# Altium footprint library OSHW_LuxonisMaster_20201223.PcbLib: 112 footprints (part 5 of 7)
Each footprint in its own frame and in the unit in brackets; x right, y up, seen from the top. Pads: shape width x height; smd on the part's side, far side on the other; paste and mask are expansions set on the pad; w line width, h text height; cw(c..) or ccw(c..) is an arc to the next point about the centre after c.
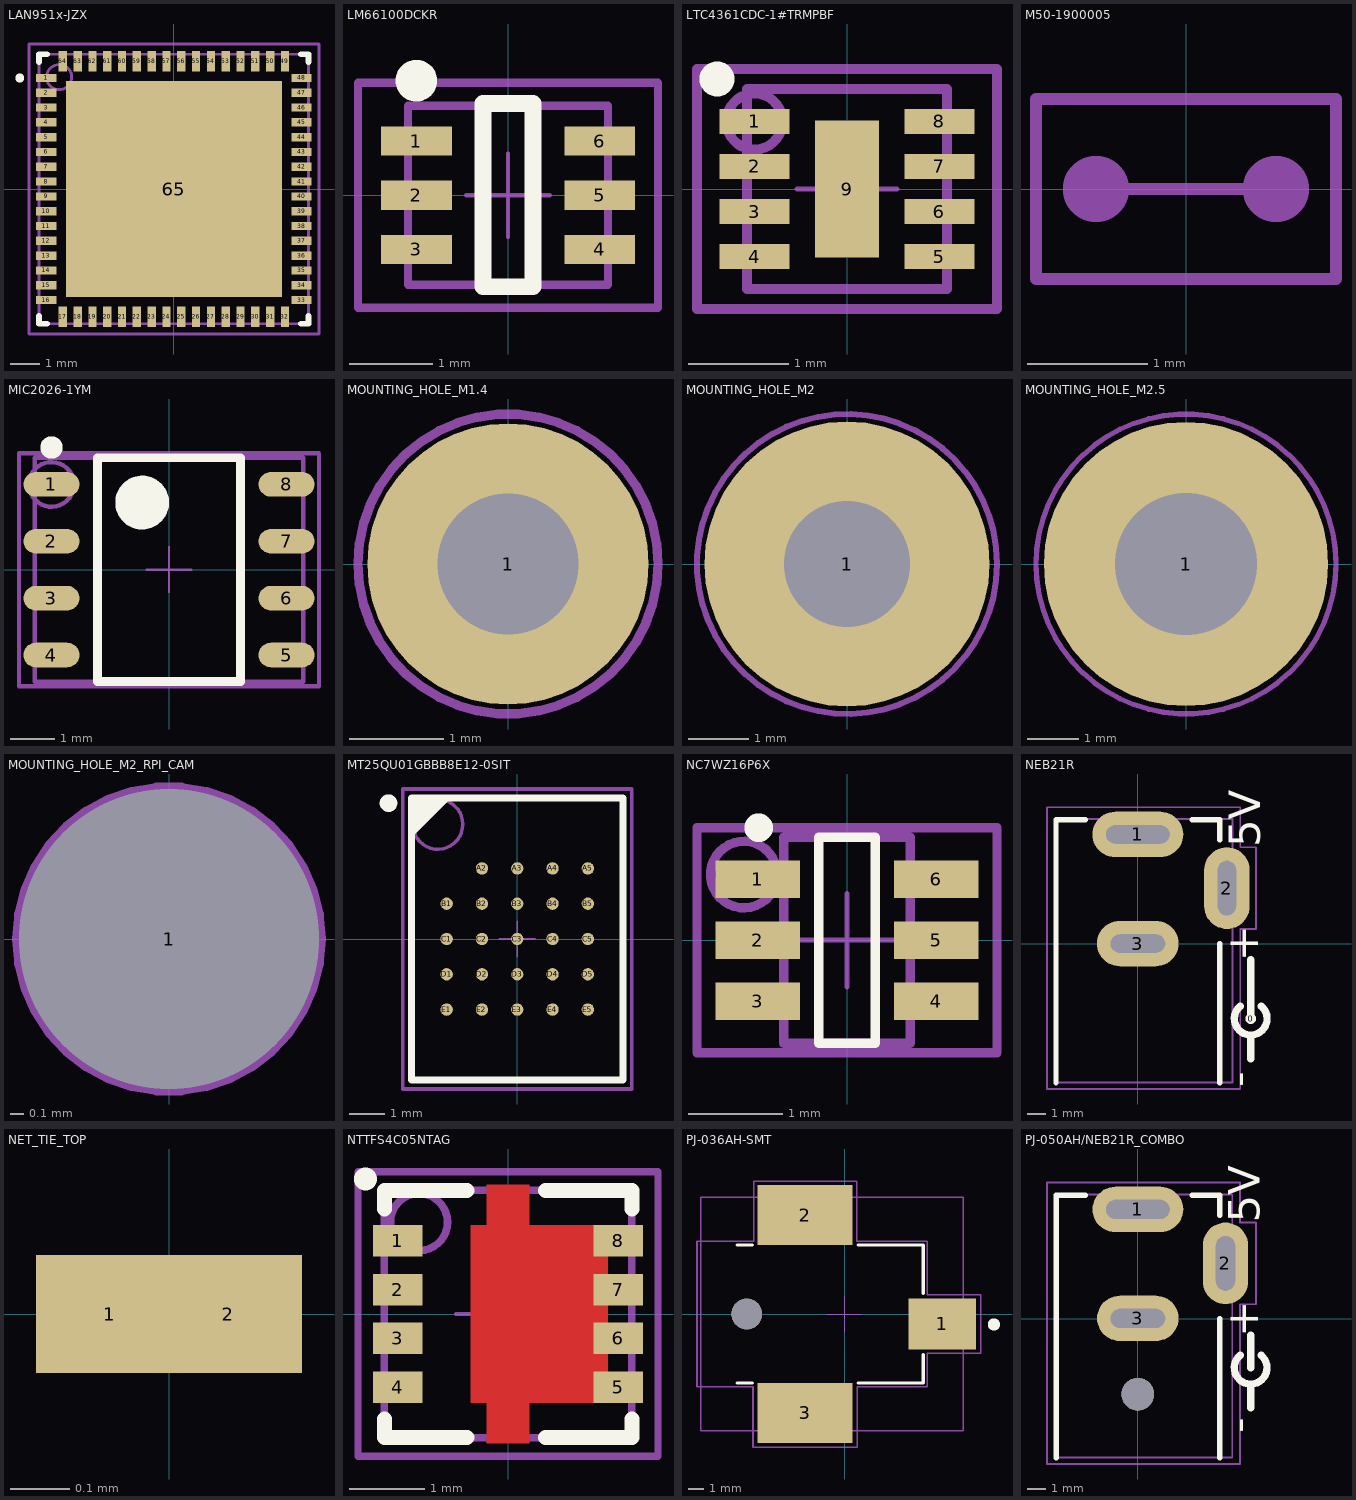
[diagram p4: the footprints below, top view; thin cyan lines are the x and y axes]

## LAN951x-JZX [mm] "LAN9513 or LAN9514 QFN, 64-Leads, Body 9.1x9.1mm, Pitch 0.5mm, Thermal Pad 7.3x7.3mm"
height 1
pads (65):
  rect 0.69x0.28 smd: 1(-4.31,3.75) 2(-4.31,3.25) 3(-4.31,2.75) 4(-4.31,2.25) 5(-4.31,1.75) 6(-4.31,1.25) 7(-4.31,0.75) 8(-4.31,0.25) 9(-4.31,-0.25) 10(-4.31,-0.75) 11(-4.31,-1.25) 12(-4.31,-1.75) 13(-4.31,-2.25) 14(-4.31,-2.75) 15(-4.31,-3.25) 16(-4.31,-3.75) 33(4.31,-3.75) 34(4.31,-3.25) 35(4.31,-2.75) 36(4.31,-2.25) 37(4.31,-1.75) 38(4.31,-1.25) 39(4.31,-0.75) 40(4.31,-0.25) 41(4.31,0.25) 42(4.31,0.75) 43(4.31,1.25) 44(4.31,1.75) 45(4.31,2.25) 46(4.31,2.75) 47(4.31,3.25) 48(4.31,3.75)
  rect 0.28x0.69 smd: 17(-3.75,-4.31) 18(-3.25,-4.31) 19(-2.75,-4.31) 20(-2.25,-4.31) 21(-1.75,-4.31) 22(-1.25,-4.31) 23(-0.75,-4.31) 24(-0.25,-4.31) 25(0.25,-4.31) 26(0.75,-4.31) 27(1.25,-4.31) 28(1.75,-4.31) 29(2.25,-4.31) 30(2.75,-4.31) 31(3.25,-4.31) 32(3.75,-4.31) 49(3.75,4.31) 50(3.25,4.31) 51(2.75,4.31) 52(2.25,4.31) 53(1.75,4.31) 54(1.25,4.31) 55(0.75,4.31) 56(0.25,4.31) 57(-0.25,4.31) 58(-0.75,4.31) 59(-1.25,4.31) 60(-1.75,4.31) 61(-2.25,4.31) 62(-2.75,4.31) 63(-3.25,4.31) 64(-3.75,4.31)
  rect 7.3x7.3 smd: 65(0,0)
Top Overlay:
  circle w0.25: c-5.205,3.75 r0.025
  lines w0.2: -4.55,-4.29 -4.55,-4.55 -4.29,-4.55 ; -4.55,4.29 -4.55,4.55 -4.29,4.55 ; 4.29,-4.55 4.55,-4.55 4.55,-4.29 ; 4.29,4.55 4.55,4.55 4.55,4.29
Top Assembly:
  lines w0.1: -3.483,3.616 cw(c-3.875,3.778) -3.471,3.65 ; -4.9,-4.9 4.9,-4.9 4.9,4.9 -4.9,4.9 -4.9,-4.9
  text "'.Designator'" at 0,0 h1
Top Courtyard:
  lines w0.05: -0.5,0 0.5,0 ; 0,-0.5 0,0.5 ; -4.9,-4.9 -4.9,4.9 4.9,4.9 4.9,-4.9 -4.9,-4.9
Top Component Outline:
  lines w0.1: -4.55,-4.55 -4.55,4.55 4.55,4.55 4.55,-4.55 -4.55,-4.55
3D body: height 1, standoff 0, extent -4.55,-4.55 4.55,4.55

## LM66100DCKR [mm] "SOT23, 6-Leads, Body 2.00x2.10mm, Pitch 0.65mm, IPC Medium Density"
height 1.1
pads (6):
  rect 0.85x0.35 smd: 1(-1.1,0.65) 2(-1.1,0) 3(-1.1,-0.65) 4(1.1,-0.65) 5(1.1,0) 6(1.1,0.65)
Top Overlay:
  circle w0.25: c-1.1,1.375 r0.125
  lines w0.2: -0.3,-1.1 0.3,-1.1 0.3,1.1 -0.3,1.1 -0.3,-1.1
Top Assembly:
  lines w0.1: -1.8,-1.35 -1.8,1.35 1.8,1.35 1.8,-1.35 -1.8,-1.35
  text "'.Designator'" at 0,0.188 h1
Top Courtyard:
  lines w0.05: -0.5,0 0.5,0 ; 0,-0.5 0,0.5 ; -1.8,-1.35 -1.8,1.35 1.8,1.35 1.8,-1.35 -1.8,-1.35
Top Component Outline:
  lines w0.1: -1.2,-1.075 -1.2,1.075 1.2,1.075 1.2,-1.075 -1.2,-1.075
3D body "SOT65P210X110-6N.step": height 1.1, standoff 0, extent -1.2,-1.075 1.2,1.075

## LTC4361CDC-1#TRMPBF [mm] "8-WFDFN Exposed Pad"
height 0.8
pads (9):
  rect 0.7x0.25 smd mask+0.05: 1(-0.925,0.675) 2(-0.925,0.225) 3(-0.925,-0.225) 4(-0.925,-0.675) 5(0.925,-0.675) 6(0.925,-0.225) 7(0.925,0.225) 8(0.925,0.675)
  rect 0.64x1.37 smd paste-0.2 mask+0.05: 9(0,0)
Top Overlay:
  circle w0.2: c-1.3,1.1 r0.075
Top Assembly:
  circle w0.1: c-0.925,0.675 r0.28
  lines w0.1: -1.5,-1.2 1.5,-1.2 1.5,1.2 -1.5,1.2 -1.5,-1.2
  text "'.Designator'" at 0,0 h1
Top Courtyard:
  lines w0.05: -0.5,0 0,0 ; 0,-0.5 0,0 ; 0,0.5 0,0 ; 0.5,0 0,0 ; -1.5,-1.2 1.5,-1.2 1.5,1.2 -1.5,1.2 -1.5,-1.2
Top Component Outline:
  lines w0.1: -1.001,-1 -1.001,1 1.001,1 1.001,-1 -1.001,-1
3D body "User Library-DFN 8.STEP": height 0.75, standoff -0.05, extent -1.001,-1 1.001,1

## M50-1900005 [mm] "Shunt for 1.27mm headers"
height 3
Top Assembly:
  circle w0.5: c0.75,0 r0.025
  circle w0.5: c-0.75,0 r0.025
  lines w0.1: -0.6,0 0.625,0 ; -1.25,-0.75 -1.25,0.75 1.25,0.75 1.25,-0.75 -1.25,-0.75
  text "'.Designator'" at 0,0 h1
3D body: height 0.84, standoff -0.61, extent 0,0 0,0
3D body: height 4.5, standoff 1.5, extent -1.25,-0.75 1.25,0.75
3D body: height 0.84, standoff -0.61, extent 0.6,0 0.6,0

## MIC2026-1YM [mm] "SOIC, 8-Leads, Body 5x4mm, Pitch 1.27mm, IPC High Density"
height 1.73
pads (8):
  oval 1.25x0.55 smd: 1(-2.625,1.905) 2(-2.625,0.635) 3(-2.625,-0.635) 4(-2.625,-1.905) 5(2.625,-1.905) 6(2.625,-0.635) 7(2.625,0.635) 8(2.625,1.905)
Top Overlay:
  circle w0.6: c-0.6,1.5 r0.3
  circle w0.25: c-2.625,2.73 r0.125
  lines w0.2: -1.6,-2.5 1.6,-2.5 1.6,2.5 -1.6,2.5 -1.6,-2.5
Top Assembly:
  circle w0.1: c-2.625,1.905 r0.5
  lines w0.1: -3.35,-2.6 -3.35,2.6 3.35,2.6 3.35,-2.6 -3.35,-2.6
  text "'.Designator'" at 0,0 h1
Top Courtyard:
  lines w0.05: -0.5,0 0.5,0 ; 0,-0.5 0,0.5 ; -3.35,-2.6 3.35,-2.6 3.35,2.6 -3.35,2.6 -3.35,-2.6
Top Component Outline:
  lines w0.1: -2.995,-2.5 2.995,-2.5 2.995,2.5 -2.995,2.5 -2.995,-2.5
3D body "SOIC127P600X173-8L.step": height 1.73, standoff 0, extent -2.995,-2.5 2.995,2.5

## MOUNTING_HOLE_M1.4 [mm] "M1.4 screw footprint. 1.5mm dia hole, 3mm dia ring,"
pads (1):
  round 3 hole 1.5 mask+0.05: 1(0,0)
Top Assembly:
  circle w0.1: c0,0 r1.6
  text "'.Designator'" at 0,0 h1
Bottom Assembly:
  circle w0.1: c0,0 r1.6
  text "'.Designator'" at 0,0 h1
Top Courtyard:
  circle w0.05: c0,0 r1.6
Bottom Courtyard:
  circle w0.05: c0,0 r1.6

## MOUNTING_HOLE_M2 [mm] "M1.4 screw footprint. 2.1 mm dia hole, 4.75mm dia ring,"
pads (1):
  round 4.75 / inner round 2.2 / far side round 4.75 hole 2.1 mask+0.05: 1(0,0)
Top Assembly:
  circle w0.1: c0,0 r2.5
  text "'.Designator'" at 0,0 h1
Bottom Assembly:
  circle w0.1: c0,0 r2.5
  text "'.Designator'" at 0,0 h1
Top Courtyard:
  circle w0.05: c0,0 r2.5
Bottom Courtyard:
  circle w0.05: c0,0 r2.5

## MOUNTING_HOLE_M2.5 [mm] "2.7mm dia hole, 5.5mm dia ring"
pads (1):
  round 5.5 / inner round 3 / far side round 5.5 hole 2.75: 1(0,0)
Top Assembly:
  circle w0.1: c0,0 r2.9
  text "'.Designator'" at 0,0 h1
Bottom Assembly:
  circle w0.1: c0,0 r2.9
  text "'.Designator'" at 0,0 h1
Top Courtyard:
  circle w0.05: c0,0 r2.9
Bottom Courtyard:
  circle w0.05: c0,0 r2.9

## MOUNTING_HOLE_M2_RPI_CAM [mil] "NPTH 2.2mm Hole Used in Raspberry Pi Camera"
pads (1):
  round 60 hole 86.61 unplated: 1(0,0)
Top Assembly:
  circle w3.94: c0,0 r43.31
  text "'.Designator'" at 0,0 h39.37
Bottom Assembly:
  circle w3.94: c0,0 r43.31
  text "'.Designator'" at 0,0 h39.37
Top Courtyard:
  circle w1.97: c0,0 r43.31
Bottom Courtyard:
  circle w1.97: c0,0 r43.31

## MT25QU01GBBB8E12-0SIT [mm] "BGA, 24-Leads, Body 6.00x8.00mmx1.20mm, Pitch 1.00mm"
height 1.2
pads (24):
  round 0.35 smd: A2(-1,2) A3(0,2) A4(1,2) A5(2,2) B1(-2,1) B2(-1,1) B3(0,1) B4(1,1) B5(2,1) C1(-2,0) C2(-1,0) C3(0,0) C4(1,0) C5(2,0) D1(-2,-1) D2(-1,-1) D3(0,-1) D4(1,-1) D5(2,-1) E1(-2,-2) E2(-1,-2) E3(0,-2) E4(1,-2) E5(2,-2)
Top Overlay:
  circle w0.25: c-3.65,3.85 r0.125
  region: -2,4 -3,3 -3,4
  lines w0.2: -3,3 -2,4 ; -3,-4 3,-4 3,4 -3,4 -3,-4
Top Assembly:
  circle w0.1: c-2.25,3.25 r0.707
  lines w0.1: -3.25,-4.25 3.25,-4.25 3.25,4.25 -3.25,4.25 -3.25,-4.25
  text "'.Designator'" at 0,0 h1
Top Courtyard:
  lines w0.05: -0.5,0 0.5,0 ; 0,-0.5 0,0.5 ; -3.25,-4.25 3.25,-4.25 3.25,4.25 -3.25,4.25 -3.25,-4.25
Top Component Outline:
  lines w0.1: -3,-4 -3,4 3,4 3,-4 -3,-4
3D body: height 1.2, standoff 0.25, extent -3,-4 3,4

## NC7WZ16P6X [mm] "NC7WZ07P6X - SOT23, 6-Leads, Body 2.00x2.10mm, Pitch 0.65mm, IPC Medium Density"
height 1
pads (6):
  rect 0.9x0.4 smd: 1(-0.95,0.65) 2(-0.95,0) 3(-0.95,-0.65) 4(0.95,-0.65) 5(0.95,0) 6(0.95,0.65)
Top Overlay:
  circle w0.254: c-0.942,1.2 r0.025
  lines w0.1: -0.3,-1.1 -0.3,1.1 0.3,1.1 0.3,-1.1 -0.3,-1.1
Top Assembly:
  circle w0.1: c-1.1,0.7 r0.355
  lines w0.1: -1.6,-1.2 -1.6,1.2 1.6,1.2 1.6,-1.2 -1.6,-1.2
  text "'.Designator'" at 0,0 h1
Top Courtyard:
  lines w0.054: -0.5,0 0.5,0 ; 0,-0.5 0,0.5 ; -1.6,-1.2 1.6,-1.2 1.6,1.2 -1.6,1.2 -1.6,-1.2
Top Component Outline:
  lines w0.1: -0.675,-1.1 0.675,-1.1 0.675,1.1 -0.675,1.1 -0.675,-1.1
3D body: height 1.1, standoff 0, extent -0.675,-1.1 0.675,1.1

## NEB21R [mm] "2.1mm ID, 5.5mm OD, 3pin, 2contact, PJ-002AH or NEB21R"
height 11
pads (4):
  round 0.6 on Top Overlay paste+0.05 mask+0.05: 0(6.21,-4.131)
  oval 5x2.5 hole 1 slot 3.5 at 0 deg mask+0.05: 1(0,6)
  oval 2.5x4.5 hole 1 slot 3 at 90 deg mask+0.05: 2(4.9,3.05)
  oval 4.5x2.5 hole 1 slot 3 at 0 deg mask+0.05: 3(0,0)
Top Overlay:
  lines w0.3: -4.5,-7.65 -4.5,6.8 -2.9,6.8 ; 3,6.8 4.5,6.8 4.5,5.7 ; 4.5,-7.65 4.5,0
  lines w0.4: 5.631,-3.442 ccw(c6.21,-4.131) 6.788,-3.442 ; 6.21,-6.341 6.21,-5.031 ; 6.21,-4.131 6.21,-0.891
  text "5V" at 7.3,5.3 h3
  text "+" at 7.2,1 h3
  text "-" at 6.9,-7.9 h3
Top Assembly:
  lines w0.1: -5,-8 -5,7.5 5.631,7.5 5.631,5.7 5.631,5.3 6.5,5.3 6.5,0.8 5.631,0.8 5.631,-8 -5,-8
  text "'.Designator'" at 0,0 h1
Top Courtyard:
  lines w0.05: -1.25,0 0,0 ; 0,-1.3 0,0 ; 0,1.25 0,0 ; 1.3,0 0,0 ; -5,-8 5.631,-8 5.631,0.8 6.5,0.8 6.5,5.3 5.631,5.3 5.631,5.7 5.631,7.5 -5,7.5 -5,-8
Top Component Outline:
  lines w0.1: -4.5,6.8 -4.5,-7.65 5.2,-7.65 5.2,6.8 ; -4.4,6.85 5.2,6.85
3D body "User Library-NEB21R.STEP": height 11.05, standoff -3.45, extent -4.5,-7.65 5.2,6.85

## NET_TIE_TOP [mm]
pads (2):
  rect 0.25x0.2 smd paste-1 mask+0.102: 1(-0.1,0) 2(0.1,0)

## NTTFS4C05NTAG [mm] "8-WDFN (3.3x3.3)"
height 0.8
pads (8):
  rect 0.66x0.42 smd mask+0.05: 1(-1.47,0.975) 2(-1.47,0.325) 3(-1.47,-0.325) 4(-1.47,-0.975) 5(1.47,-0.975) 6(1.47,-0.325) 7(1.47,0.325) 8(1.47,0.975)
Top Layer:
  rectangle: -0.285,-1.73 0.285,1.73
  region: 1.33,1.185 -0.5,1.185 -0.5,-1.185 1.33,-1.185
Top Overlay:
  circle w0.254: c-1.9,1.8 r0.025
  lines w0.2: -1.65,-1.4 -1.65,-1.65 -0.55,-1.65 ; -1.65,1.4 -1.65,1.65 -0.55,1.65 ; 0.5,-1.65 1.65,-1.65 1.65,-1.4 ; 0.5,1.65 1.65,1.65 1.65,1.4
Top Paste:
  rectangle: -0.275,0.225 0.7,0.925
  rectangle: -0.275,-0.925 0.7,-0.225
Top Assembly:
  circle w0.102: c-1.187,1.225 r0.381
  lines w0.1: -2,-1.9 -2,1.9 2,1.9 2,-1.9 -2,-1.9
  text "'.Designator'" at 0,0 h1
Top Courtyard:
  lines w0.05: -0.698,0 0,0 ; 0,-0.765 0,0.765 0,0 ; 0.698,0 0,0 ; -2,-1.9 2,-1.9 2,1.9 -2,1.9 -2,-1.9
Top Component Outline:
  lines w0.102: 1.65,-1.65 -1.65,-1.65 -1.65,1.65 1.65,1.65 ; 1.65,-1.65 1.65,-1.65 ; 1.65,-1.65 1.65,1.65 ; 1.65,1.65 1.65,1.65
3D body: height 0.8, standoff 0, extent -1.65,-1.65 1.65,1.65

## PJ-036AH-SMT [mm] "2.0 x 6.3 mm, 5.0 A, Horizontal, Surface Mount (SMT), Dc Power Jack Connector"
pads (4):
  rect 4.4x3.3 smd: 1(6.375,-0.65)
  rect 6.2x3.9 smd: 2(-2.575,6.45) 3(-2.575,-6.45)
  round 2 hole 2 unplated: ""(-6.375,0)
Top Overlay:
  circle w0.4: c9.733,-0.68 r0.2
  lines w0.2: -7,-4.5 -6,-4.5 ; -7,4.5 -6,4.5 ; 0.875,-4.5 5.125,-4.5 5.125,-2.65 ; 0.875,4.5 5.125,4.5 5.125,1.35
Top Assembly:
  lines w0.1: -9.625,-4.75 -9.625,4.75 -5.925,4.75 -5.925,8.65 0.775,8.65 0.775,4.75 5.375,4.75 5.375,1.25 8.875,1.25 8.875,-2.55 5.375,-2.55 5.375,-4.75 0.825,-4.75 0.825,-8.7 -5.975,-8.7 -5.975,-4.75 -9.625,-4.75
  text "'.Designator'" at 0.005,0 h1
Top Courtyard:
  lines w0.05: -1.15,0 0,0 ; 0,-1.2 0,0 ; 0,1.15 0,0 ; 1.1,0 0,0 ; -9.625,-4.75 -5.975,-4.75 -5.975,-8.7 0.825,-8.7 0.825,-4.75 5.375,-4.75 5.375,-2.55 8.875,-2.55 8.875,1.25 5.375,1.25 5.375,4.75 0.775,4.75 0.775,8.65 -5.925,8.65 -5.925,4.75 -9.625,4.75 -9.625,-4.75
Top Component Outline:
  lines w0.102: -9.375,-7.6 7.725,-7.6 7.725,7.6 -9.375,7.6 -9.375,-7.6
3D body "CUI_PJ-036AH-SMT-TR.step": height 11.05, standoff -1.55, extent -9.375,-7.6 7.725,7.6

## PJ-050AH/NEB21R_COMBO [mm] "PJ-050AH or NEB21R 2.1mm ID, 5.5mm OD, 3pin, 2contact"
height 11
pads (4):
  oval 5x2.5 hole 1.05 slot 3.5 at 0 deg mask+0.05: 1(0,6.025)
  oval 2.5x4.5 hole 1.05 slot 3 at 90 deg mask+0.05: 2(4.825,3.05)
  oval 4.5x2.5 hole 1.05 slot 3 at 0 deg mask+0.05: 3(0,0.025)
  round 1.8 hole 1.8 unplated: ""(0,-4.15)
Top Overlay:
  lines w0.3: -4.5,-7.65 -4.5,6.8 -2.9,6.8 ; 3,6.8 4.5,6.8 4.5,5.7 ; 4.5,-7.65 4.5,0
  lines w0.4: 5.631,-2.011 ccw(c6.21,-2.7) 6.788,-2.011 ; 6.21,-4.91 6.21,-3.6 ; 6.21,-2.7 6.21,-0.891
  text "5V" at 7.3,5.3 h3
  text "+" at 7.2,1 h3
  text "-" at 6.9,-6.3 h3
Top Assembly:
  lines w0.1: -5,-8 -5,7.5 5.631,7.5 5.631,5.7 5.631,5.3 6.5,5.3 6.5,0.8 5.631,0.8 5.631,-8 -5,-8
  text "'.Designator'" at 0,0 h1
Top Courtyard:
  lines w0.05: -1.25,0 0,0 ; 0,-1.3 0,0 ; 0,1.25 0,0 ; 1.3,0 0,0 ; -5,-8 5.631,-8 5.631,0.8 6.5,0.8 6.5,5.3 5.631,5.3 5.631,5.7 5.631,7.5 -5,7.5 -5,-8
Top Component Outline:
  lines w0.1: -4.5,6.8 -4.5,-7.65 5.2,-7.65 5.2,6.8 ; -4.4,6.85 5.2,6.85
3D body "CUI_PJ-050AH.step": height 11, standoff -2.2, extent -4.5,-7.65 5,6.75
3D body "User Library-NEB21R.STEP": height 11.05, standoff -3.45, extent -4.5,-7.65 5.2,6.85